# Altium footprint library 常用元件封装库.PcbLib: 1310 footprints (part 11 of 83)
Each footprint in its own frame and in the unit in brackets; x right, y up, seen from the top. Pads: shape width x height; smd on the part's side, far side on the other; paste and mask are expansions set on the pad; w line width, h text height; cw(c..) or ccw(c..) is an arc to the next point about the centre after c.
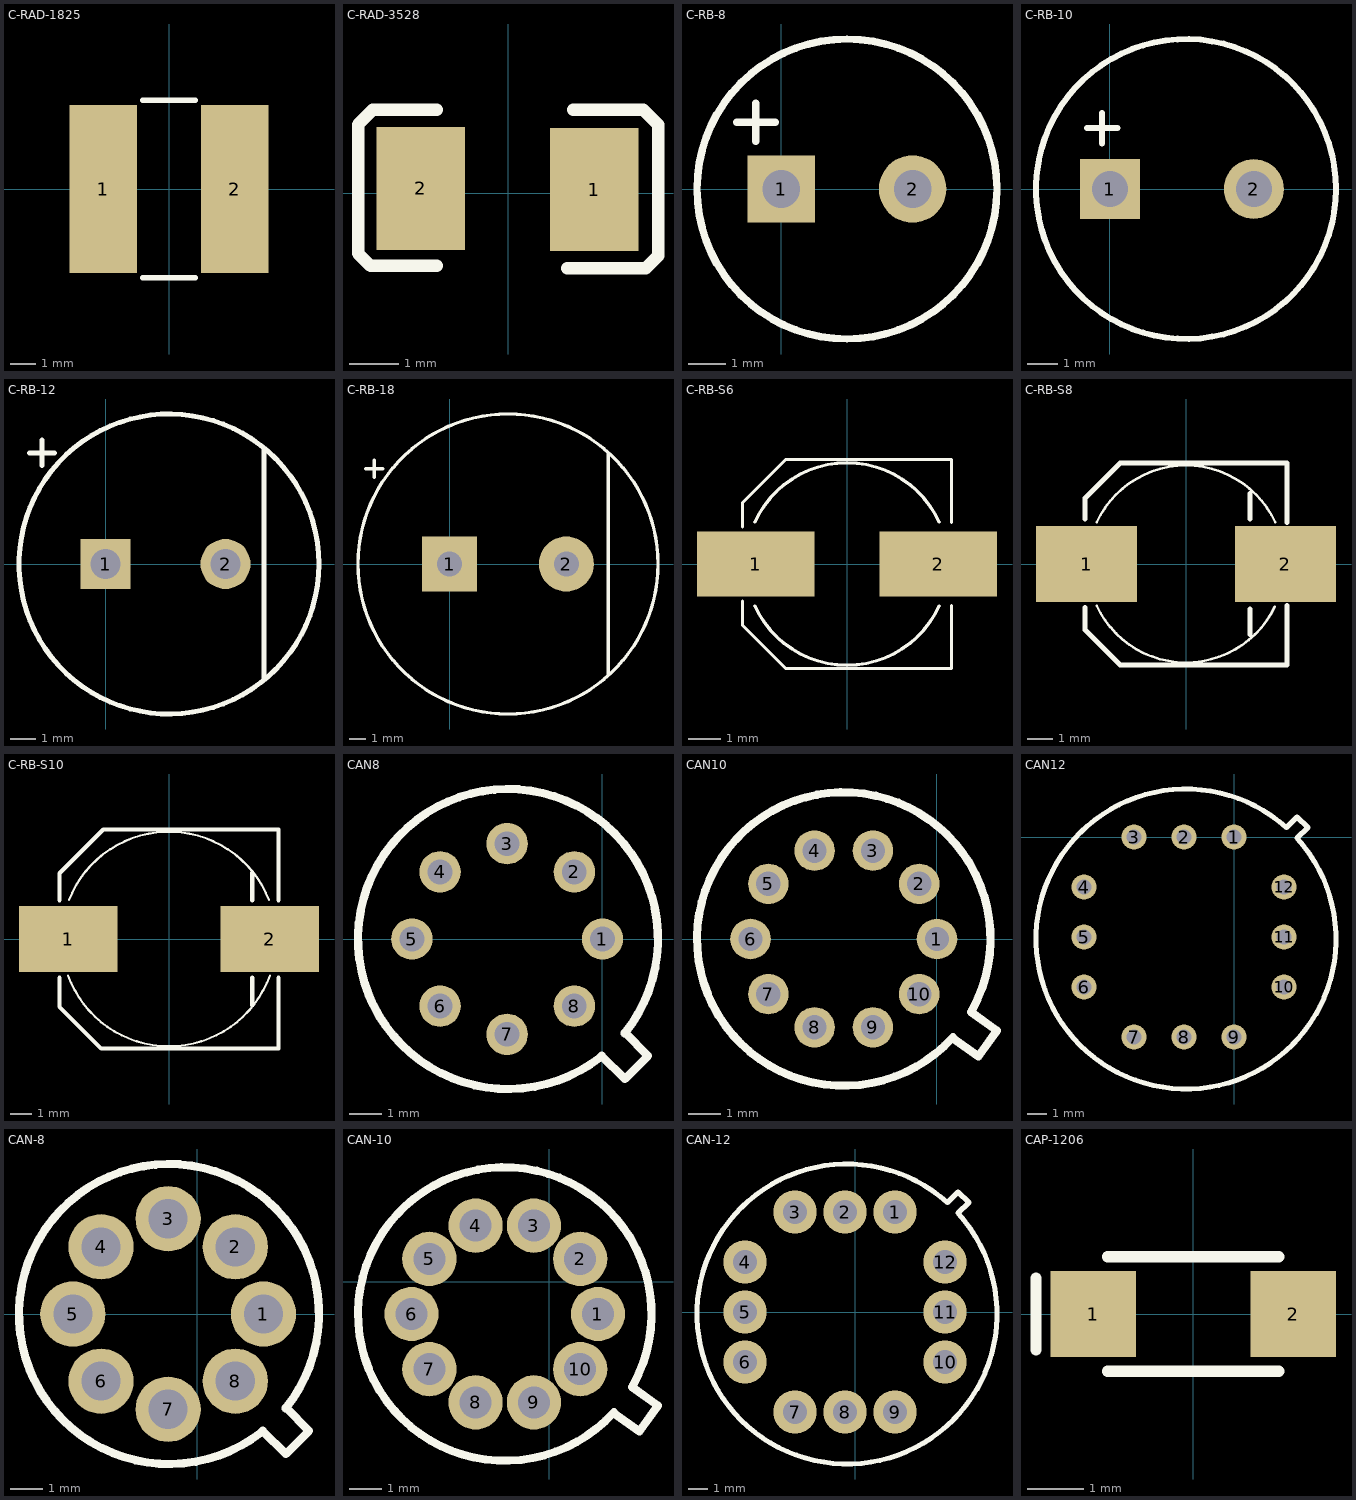
[diagram p10: the footprints below, top view; thin cyan lines are the x and y axes]

## C-RAD-1825 [mm] "贴片电阻"
pads (2):
  rect 2.6x6.5 smd: 1(-2.54,0) 2(2.54,0)
Top Overlay:
  lines w0.2: -1.016,-3.429 1.016,-3.429 ; -1.016,3.429 1.016,3.429
3D body: height 1.2, standoff 0, extent -2.286,-3.175 2.286,3.175

## C-RAD-3528 [mm] "贴片电容"
height 3
pads (2):
  rect 1.8x2.5 smd: 1(1.753,0.075) 2(-1.772,0.1)
Top Overlay:
  lines w0.254: -1.447,-1.475 -2.794,-1.475 -3.048,-1.221 -3.048,1.397 -2.745,1.7 -1.447,1.7 ; 1.203,-1.524 2.794,-1.524 3.048,-1.27 3.048,1.397 2.794,1.651 2.745,1.7 1.328,1.7

## C-RB-8 [mm] "35V 220UF电容"
height 12
pads (2):
  rect 1.8x1.8 hole 1: 1(0,0)
  round 1.8 hole 1: 2(3.5,0)
Top Overlay:
  circle w0.2: c1.75,0 r4
  lines w0.2: -1.185,1.778 -0.169,1.778 ; -0.677,1.27 -0.677,2.286

## C-RB-10 [mm] "35V470uF电容"
height 16
pads (2):
  rect 2x2 hole 1.2: 1(0,0)
  round 2 hole 1.2: 2(4.8,0)
Top Overlay:
  circle w0.2: c2.54,0 r5
  lines w0.2: -0.762,2.032 0.254,2.032 ; -0.254,1.524 -0.254,2.54

## C-RB-12 [mm] "35V470uF电容"
height 20
pads (2):
  rect 2x2 hole 1.2: 1(0,0)
  round 2 hole 1.2: 2(4.8,0)
Top Overlay:
  circle w0.2: c2.54,0 r6
  lines w0.2: -3.048,4.445 -2.032,4.445 ; -2.54,3.937 -2.54,4.953 ; 6.35,-4.572 6.35,4.572

## C-RB-18 [mm] "35V2200uF电容"
height 20
pads (2):
  rect 3.3x3.3 hole 1.5: 1(0,0)
  round 3.3 hole 1.5: 2(7,0)
Top Overlay:
  circle w0.2: c3.5,0 r9
  lines w0.2: -5.037,5.715 -4.021,5.715 ; -4.529,5.207 -4.529,6.223 ; 9.525,-6.604 9.525,6.604

## C-RB-S6 [mm] "贴片电解"
height 7
pads (2):
  rect 3.6x2 smd: 1(-2.794,0) 2(2.794,0)
Top Overlay:
  lines w0.1: -3.2,-1.143 -3.2,-1.88 -1.88,-3.2 3.2,-3.2 3.2,-1.27 ; -3.2,1.143 -3.2,1.88 -1.88,3.2 3.2,3.2 3.2,1.27 ; -2.822,-1.283 ccw(c0,0) 2.822,-1.283 ; -2.822,1.283 cw(c0,0) 2.822,1.283

## C-RB-S8 [mm] "贴片电解"
height 10.2
pads (2):
  rect 4x3 smd: 1(-3.937,0) 2(3.937,0)
Top Overlay:
  lines w0.1: -3.539,-1.643 ccw(c0,0) 3.516,-1.693 ; -3.539,1.643 cw(c0,0) 3.539,1.643
  lines w0.2: -4,-1.714 -4,-2.604 -2.604,-4 4,-4 4,-1.651 ; -4,1.778 -4,2.604 -2.604,4 4,4 4,1.651 ; 2.54,-2.794 2.54,-1.778 ; 2.54,1.778 2.54,2.794
3D body: height 0.6, standoff 0, extent -3.937,-3.937 3.937,3.937
3D body: height 10.9, standoff 0.9, extent -3.849,-3.872 3.88,3.872

## C-RB-S10 [mm] "贴片电解"
height 10.2
pads (2):
  rect 4.5x3 smd: 1(-4.6,0) 2(4.6,0)
Top Overlay:
  lines w0.1: -4.609,-1.664 ccw(c0,0) 4.609,-1.664 ; -4.567,1.776 cw(c0,0) 4.567,1.776
  lines w0.2: -5,-1.778 -5,-3.1 -3.1,-5 5,-5 5,-1.778 ; -5,1.778 -5,3 -3,5 5,5 5,1.778 ; 3.8,-3.032 3.8,-1.778 ; 3.8,1.778 3.8,3.032

## CAN8 [mil]
pads (8):
  round 50 hole 30: 1(0,0) 2(-34,81) 3(-115,115) 4(-196,81) 5(-230,0) 6(-196,-81) 7(-115,-115) 8(-34,-81)
Top Overlay:
  lines w10: -2.57,-142.63 cw(c-114,0) 26.66,-113.91 ; -1,-141 27,-169 55,-141 27,-113

## CAN10 [mil]
pads (10):
  round 50 hole 30: 1(0,0) 2(-22,68) 3(-79,109) 4(-151,109) 5(-208,68) 6(-230,0) 7(-208,-68) 8(-151,-109) 9(-79,-109) 10(-22,-68)
Top Overlay:
  lines w10: 19,-122 51,-145 74,-113 42,-90 ; 19.51,-121.11 cw(c-115,0) 43.31,-87.75

## CAN12 [mil]
pads (12):
  round 50 hole 30: 1(0,0) 2(-100,0) 3(-200,0) 4(-300,-100) 5(-300,-200) 6(-300,-300) 7(-200,-400) 8(-100,-400) 9(0,-400) 10(100,-300) 11(100,-200) 12(100,-100)
Top Overlay:
  lines w10: 104.74,18.94 ccw(c-96,-204) 126.94,-3.26 ; 105,19 126,40 148,19 126,-2

## CAN-8 [mm]
pads (8):
  round 2 hole 1.2: 1(2.032,0) 2(1.168,2.057) 3(-0.889,2.921) 4(-2.946,2.057) 5(-3.81,0) 6(-2.946,-2.057) 7(-0.889,-2.921) 8(1.168,-2.057)
Top Overlay:
  lines w0.254: 1.967,-3.623 cw(c-0.864,0) 2.709,-2.893 ; 2.007,-3.581 2.718,-4.293 3.429,-3.581 2.718,-2.87

## CAN-10 [mm]
pads (10):
  round 1.7 hole 1: 1(1.524,-1.016) 2(0.965,0.711) 3(-0.483,1.753) 4(-2.311,1.753) 5(-3.759,0.711) 6(-4.318,-1.016) 7(-3.759,-2.743) 8(-2.311,-3.785) 9(-0.483,-3.785) 10(0.965,-2.743)
Top Overlay:
  lines w0.254: 2.007,-4.115 2.819,-4.699 3.404,-3.886 2.591,-3.302 ; 2.02,-4.092 cw(c-1.397,-1.016) 2.624,-3.245

## CAN-12 [mm]
pads (12):
  round 2.2 hole 1.2: 1(2.032,5.08) 2(-0.508,5.08) 3(-3.048,5.08) 4(-5.588,2.54) 5(-5.588,0) 6(-5.588,-2.54) 7(-3.048,-5.08) 8(-0.508,-5.08) 9(2.032,-5.08) 10(4.572,-2.54) 11(4.572,0) 12(4.572,2.54)
Top Overlay:
  lines w0.254: 4.692,5.561 ccw(c-0.406,-0.102) 5.256,4.997 ; 4.699,5.563 5.232,6.096 5.791,5.563 5.232,5.029

## CAP-1206 [mil] "贴片元件"
height 59.06
pads (2):
  rect 60x60 smd: 1(-70,0) 2(70,0)
Top Overlay:
  lines w7.87: -110,-25 -110,25 ; -60,-40 60,-40 ; -60,40 60,40
3D body: height 39.37, standoff 0, extent -55,-35 55,35
3D body: height 39.37, standoff 0, extent 45,-35 65,35
3D body: height 39.37, standoff 0, extent -65,-35 -45,35